# Altium schematic symbol library Regulator_Switching.SchLib: 1120 symbols (part 6 of 8)
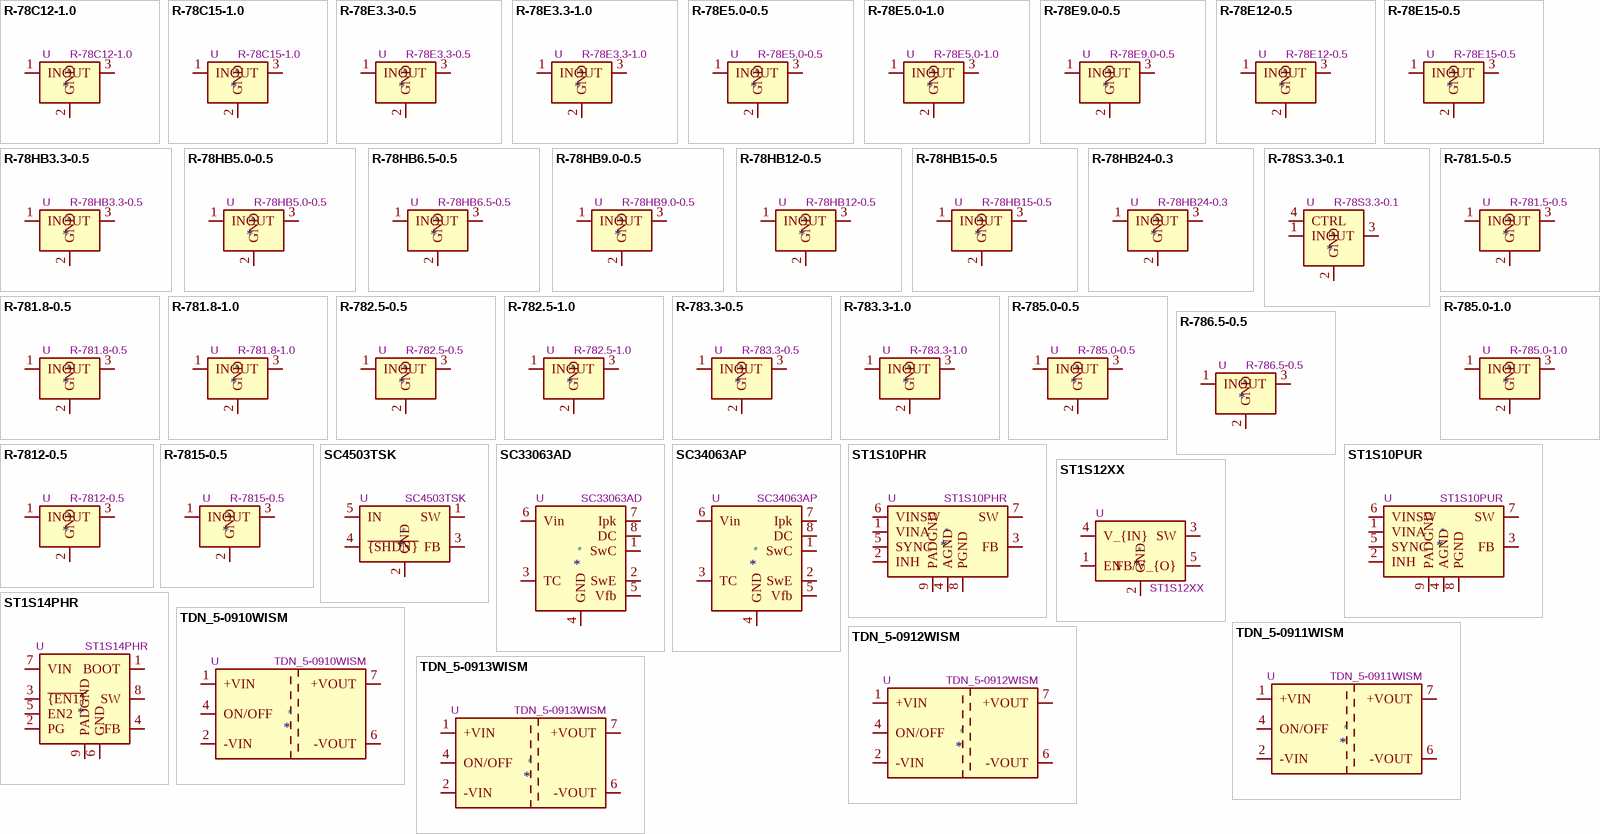
[diagram p32: symbols R-78C12-1.0 to TDN_5-0913WISM]

## TDN_5-0913WISM
designator *  value TDN_5-0913WISM  Reference: U
ki_keywords: dcdc traco 5W; ki_description: Input 4.5 to 13.2V, Output 15.0V; ki_fp_filters: Converter?DCDC?TRACO?TDN?5*WISM?SMD*; Footprint: Converter_DCDC:Converter_DCDC_TRACO_TDN_5-xxxxWISM_SMD; Datasheet: https://assets.tracopower.com/20190626081517/TDN5WISM/documents/tdn5wism-datasheet.pdf
pins: 1 +VIN, 2 -VIN, 4 ON/OFF, 5 NC hidden, 6 -VOUT, 7 +VOUT

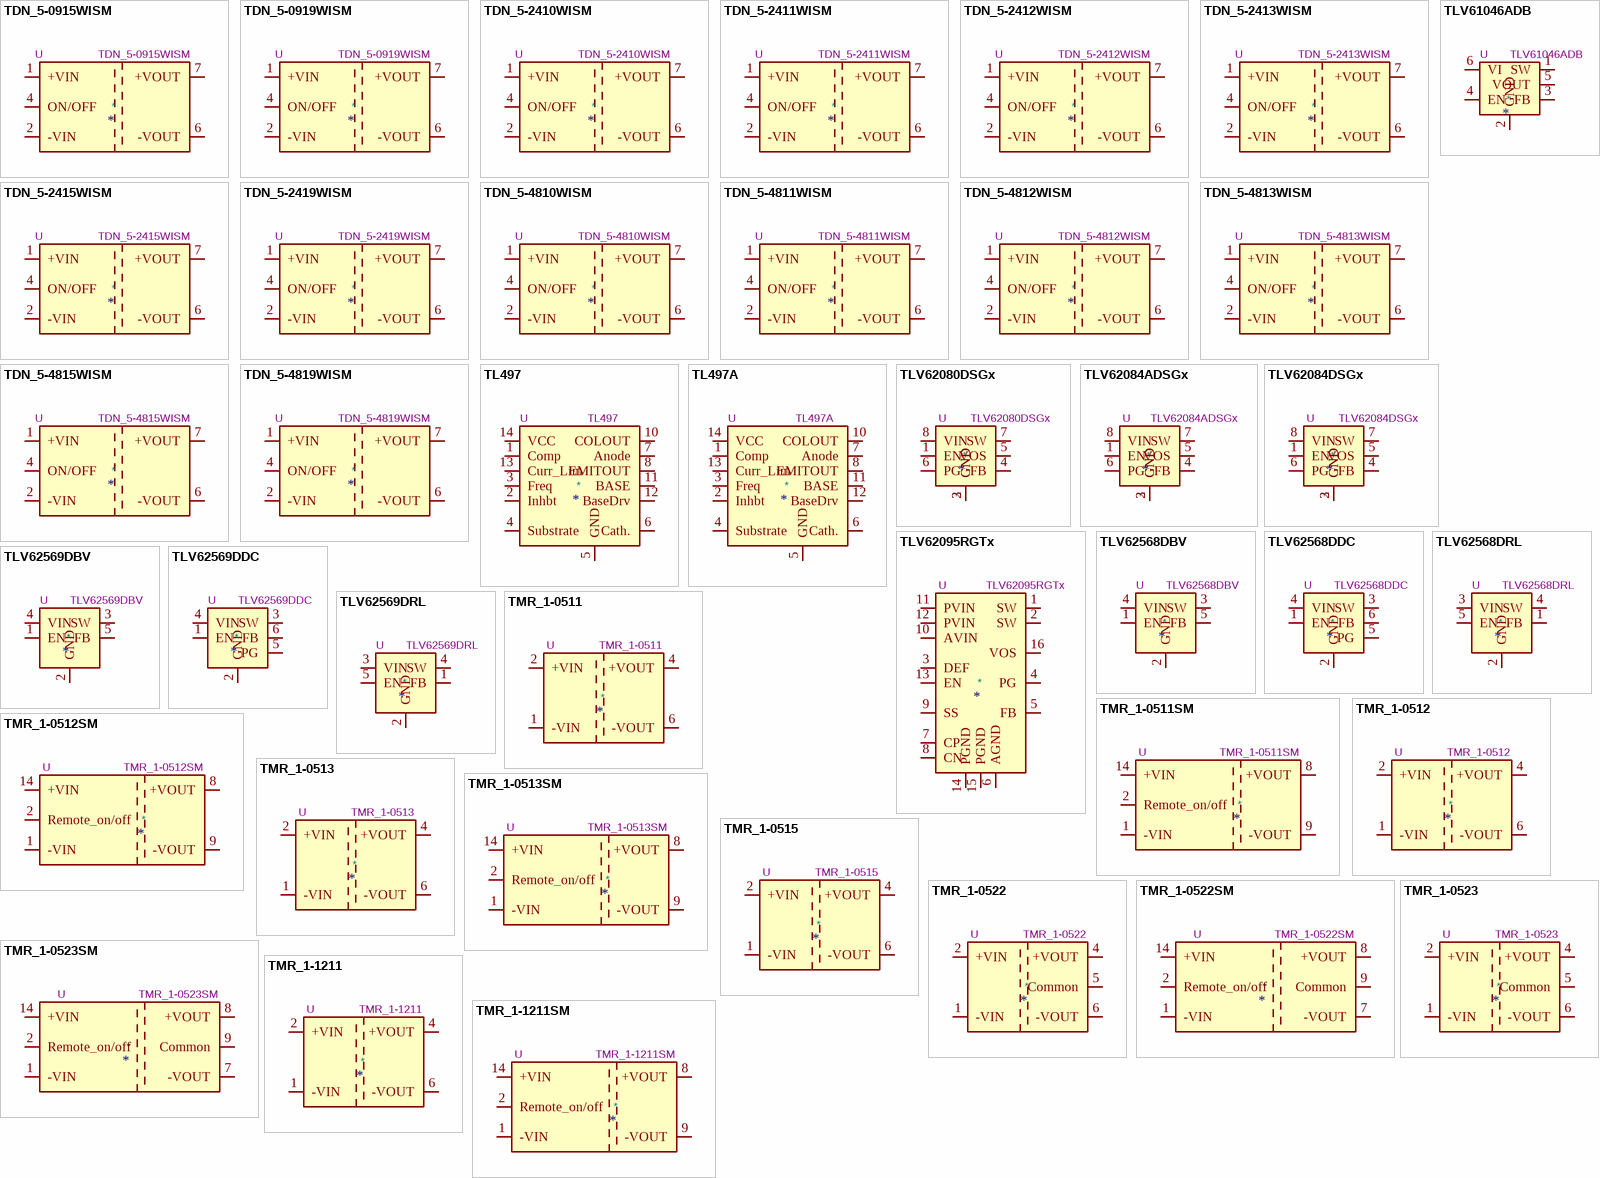
[diagram p19: symbols TDN_5-0915WISM to TMR_1-1211SM]

## TDN_5-0915WISM
designator *  value TDN_5-0915WISM  Reference: U
ki_keywords: dcdc traco 5W; ki_description: Input 4.5 to 13.2V, Output 24.0V; ki_fp_filters: Converter?DCDC?TRACO?TDN?5*WISM?SMD*; Footprint: Converter_DCDC:Converter_DCDC_TRACO_TDN_5-xxxxWISM_SMD; Datasheet: https://assets.tracopower.com/20190626081517/TDN5WISM/documents/tdn5wism-datasheet.pdf
pins: 1 +VIN, 2 -VIN, 4 ON/OFF, 5 NC hidden, 6 -VOUT, 7 +VOUT

## TDN_5-0919WISM
designator *  value TDN_5-0919WISM  Reference: U
ki_keywords: dcdc traco 5W; ki_description: Input 4.5 to 13.2V, Output 9.0V; ki_fp_filters: Converter?DCDC?TRACO?TDN?5*WISM?SMD*; Footprint: Converter_DCDC:Converter_DCDC_TRACO_TDN_5-xxxxWISM_SMD; Datasheet: https://assets.tracopower.com/20190626081517/TDN5WISM/documents/tdn5wism-datasheet.pdf
pins: 1 +VIN, 2 -VIN, 4 ON/OFF, 5 NC hidden, 6 -VOUT, 7 +VOUT

## TDN_5-2410WISM
designator *  value TDN_5-2410WISM  Reference: U
ki_keywords: dcdc traco 5W; ki_description: Input 9.0 to 36.0V, Output 3.3V; ki_fp_filters: Converter?DCDC?TRACO?TDN?5*WISM?SMD*; Footprint: Converter_DCDC:Converter_DCDC_TRACO_TDN_5-xxxxWISM_SMD; Datasheet: https://assets.tracopower.com/20190626081517/TDN5WISM/documents/tdn5wism-datasheet.pdf
pins: 1 +VIN, 2 -VIN, 4 ON/OFF, 5 NC hidden, 6 -VOUT, 7 +VOUT

## TDN_5-2411WISM
designator *  value TDN_5-2411WISM  Reference: U
ki_keywords: dcdc traco 5W; ki_description: Input 9.0 to 36.0V, Output 5.0V; ki_fp_filters: Converter?DCDC?TRACO?TDN?5*WISM?SMD*; Footprint: Converter_DCDC:Converter_DCDC_TRACO_TDN_5-xxxxWISM_SMD; Datasheet: https://assets.tracopower.com/20190626081517/TDN5WISM/documents/tdn5wism-datasheet.pdf
pins: 1 +VIN, 2 -VIN, 4 ON/OFF, 5 NC hidden, 6 -VOUT, 7 +VOUT

## TDN_5-2412WISM
designator *  value TDN_5-2412WISM  Reference: U
ki_keywords: dcdc traco 5W; ki_description: Input 9.0 to 36.0V, Output 12.0V; ki_fp_filters: Converter?DCDC?TRACO?TDN?5*WISM?SMD*; Footprint: Converter_DCDC:Converter_DCDC_TRACO_TDN_5-xxxxWISM_SMD; Datasheet: https://assets.tracopower.com/20190626081517/TDN5WISM/documents/tdn5wism-datasheet.pdf
pins: 1 +VIN, 2 -VIN, 4 ON/OFF, 5 NC hidden, 6 -VOUT, 7 +VOUT

## TDN_5-2413WISM
designator *  value TDN_5-2413WISM  Reference: U
ki_keywords: dcdc traco 5W; ki_description: Input 9.0 to 36.0V, Output 15.0V; ki_fp_filters: Converter?DCDC?TRACO?TDN?5*WISM?SMD*; Footprint: Converter_DCDC:Converter_DCDC_TRACO_TDN_5-xxxxWISM_SMD; Datasheet: https://assets.tracopower.com/20190626081517/TDN5WISM/documents/tdn5wism-datasheet.pdf
pins: 1 +VIN, 2 -VIN, 4 ON/OFF, 5 NC hidden, 6 -VOUT, 7 +VOUT

## TDN_5-2415WISM
designator *  value TDN_5-2415WISM  Reference: U
ki_keywords: dcdc traco 5W; ki_description: Input 9.0 to 36.0V, Output 24.0V; ki_fp_filters: Converter?DCDC?TRACO?TDN?5*WISM?SMD*; Footprint: Converter_DCDC:Converter_DCDC_TRACO_TDN_5-xxxxWISM_SMD; Datasheet: https://assets.tracopower.com/20190626081517/TDN5WISM/documents/tdn5wism-datasheet.pdf
pins: 1 +VIN, 2 -VIN, 4 ON/OFF, 5 NC hidden, 6 -VOUT, 7 +VOUT

## TDN_5-2419WISM
designator *  value TDN_5-2419WISM  Reference: U
ki_keywords: dcdc traco 5WW; ki_description: Input 9.0 to 36.0V, Output 9.0V; ki_fp_filters: Converter?DCDC?TRACO?TDN?5*WISM?SMD*; Footprint: Converter_DCDC:Converter_DCDC_TRACO_TDN_5-xxxxWISM_SMD; Datasheet: https://assets.tracopower.com/20190626081517/TDN5WISM/documents/tdn5wism-datasheet.pdf
pins: 1 +VIN, 2 -VIN, 4 ON/OFF, 5 NC hidden, 6 -VOUT, 7 +VOUT

## TDN_5-4810WISM
designator *  value TDN_5-4810WISM  Reference: U
ki_keywords: dcdc traco 5W; ki_description: Input 18.0 to 75.0V, Output 3.3V; ki_fp_filters: Converter?DCDC?TRACO?TDN?5*WISM?SMD*; Footprint: Converter_DCDC:Converter_DCDC_TRACO_TDN_5-xxxxWISM_SMD; Datasheet: https://assets.tracopower.com/20190626081517/TDN5WISM/documents/tdn5wism-datasheet.pdf
pins: 1 +VIN, 2 -VIN, 4 ON/OFF, 5 NC hidden, 6 -VOUT, 7 +VOUT

## TDN_5-4811WISM
designator *  value TDN_5-4811WISM  Reference: U
ki_keywords: dcdc traco 5W; ki_description: Input 18.0 to 75.0V, Output 5.0V; ki_fp_filters: Converter?DCDC?TRACO?TDN?5*WISM?SMD*; Footprint: Converter_DCDC:Converter_DCDC_TRACO_TDN_5-xxxxWISM_SMD; Datasheet: https://assets.tracopower.com/20190626081517/TDN5WISM/documents/tdn5wism-datasheet.pdf
pins: 1 +VIN, 2 -VIN, 4 ON/OFF, 5 NC hidden, 6 -VOUT, 7 +VOUT

## TDN_5-4812WISM
designator *  value TDN_5-4812WISM  Reference: U
ki_keywords: dcdc traco 5W; ki_description: Input 18.0 to 75.0V, Output 12.0V; ki_fp_filters: Converter?DCDC?TRACO?TDN?5*WISM?SMD*; Footprint: Converter_DCDC:Converter_DCDC_TRACO_TDN_5-xxxxWISM_SMD; Datasheet: https://assets.tracopower.com/20190626081517/TDN5WISM/documents/tdn5wism-datasheet.pdf
pins: 1 +VIN, 2 -VIN, 4 ON/OFF, 5 NC hidden, 6 -VOUT, 7 +VOUT

## TDN_5-4813WISM
designator *  value TDN_5-4813WISM  Reference: U
ki_keywords: dcdc traco 5W; ki_description: Input 18.0 to 75.0V, Output 15.0V; ki_fp_filters: Converter?DCDC?TRACO?TDN?5*WISM?SMD*; Footprint: Converter_DCDC:Converter_DCDC_TRACO_TDN_5-xxxxWISM_SMD; Datasheet: https://assets.tracopower.com/20190626081517/TDN5WISM/documents/tdn5wism-datasheet.pdf
pins: 1 +VIN, 2 -VIN, 4 ON/OFF, 5 NC hidden, 6 -VOUT, 7 +VOUT

## TDN_5-4815WISM
designator *  value TDN_5-4815WISM  Reference: U
ki_keywords: dcdc traco 5W; ki_description: Input 18.0 to 75.0V, Output 24.0V; ki_fp_filters: Converter?DCDC?TRACO?TDN?5*WISM?SMD*; Footprint: Converter_DCDC:Converter_DCDC_TRACO_TDN_5-xxxxWISM_SMD; Datasheet: https://assets.tracopower.com/20190626081517/TDN5WISM/documents/tdn5wism-datasheet.pdf
pins: 1 +VIN, 2 -VIN, 4 ON/OFF, 5 NC hidden, 6 -VOUT, 7 +VOUT

## TDN_5-4819WISM
designator *  value TDN_5-4819WISM  Reference: U
ki_keywords: dcdc traco 5W; ki_description: Input 18.0 to 75.0V, Output 9.0V; ki_fp_filters: Converter?DCDC?TRACO?TDN?5*WISM?SMD*; Footprint: Converter_DCDC:Converter_DCDC_TRACO_TDN_5-xxxxWISM_SMD; Datasheet: https://assets.tracopower.com/20190626081517/TDN5WISM/documents/tdn5wism-datasheet.pdf
pins: 1 +VIN, 2 -VIN, 4 ON/OFF, 5 NC hidden, 6 -VOUT, 7 +VOUT

## TL497
designator *  value TL497  Reference: U
ki_keywords: buck regulator; ki_description: 500mA step up/step down/inverting switching voltage regulator, SIP-14/SOIC-14(W); ki_fp_filters: DIP*W7.62mm* SOIC*7.5x9.0mm*P1.27mm* SOIC*3.9x8.7mm*P1.27mm*; Datasheet: http://www.ti.com/lit/ds/symlink/tl497a.pdf
pins: 1 Comp, 2 Inhbt, 3 Freq, 4 Substrate, 5 GND, 6 Cath., 7 Anode, 8 EMITOUT, 9 NC hidden, 10 COLOUT, 11 BASE, 12 BaseDrv, 13 Curr_Lim, 14 VCC

## TL497A
designator *  value TL497A  Reference: U
ki_keywords: buck regulator; ki_description: 500mA step up/step down switching regulator; ki_fp_filters: DIP*W7.62mm* SOIC*7.5x9.0mm*P1.27mm* SOIC*3.9x8.7mm*P1.27mm*; Datasheet: http://www.ti.com/lit/ds/symlink/tl497a.pdf
pins: 1 Comp, 2 Inhbt, 3 Freq, 4 Substrate, 5 GND, 6 Cath., 7 Anode, 8 EMITOUT, 9 NC hidden, 10 COLOUT, 11 BASE, 12 BaseDrv, 13 Curr_Lim, 14 VCC

## TLV61046ADB
designator *  value TLV61046ADB  Reference: U
ki_keywords: Step-Up DC-DC Converter; ki_description: 28-V Output Voltage Boost Converter with Power Diode and Isolation Switch, SOT-23-6; ki_fp_filters: SOT?23*; Footprint: Package_TO_SOT_SMD:SOT-23-6; Datasheet: http://www.ti.com/lit/ds/symlink/tlv61046a.pdf
pins: 1 SW, 2 GND, 3 FB, 4 EN, 5 VOUT, 6 VI

## TLV62080DSGx
designator *  value TLV62080DSGx  Reference: U
ki_keywords: Synchronous Buck; ki_description: High-efficiency Step-down Converter; ki_fp_filters: *WSON?8?1EP*2x2mm*P0.5mm*; Footprint: Package_SON:WSON-8-1EP_2x2mm_P0.5mm_EP0.9x1.6mm; Datasheet: http://www.ti.com/lit/ds/symlink/tlv62080.pdf
pins: 1 EN, 2 GND, 3 GND, 4 FB, 5 VOS, 6 PG, 7 SW, 8 VIN, 9 GND hidden

## TLV62084ADSGx
designator *  value TLV62084ADSGx  Reference: U
ki_keywords: Synchronous Buck; ki_description: High-efficiency Step-down Converter; ki_fp_filters: *WSON?8?1EP*2x2mm*P0.5mm*; Footprint: Package_SON:WSON-8-1EP_2x2mm_P0.5mm_EP0.9x1.6mm; Datasheet: http://www.ti.com/lit/ds/symlink/tlv62080.pdf
pins: 1 EN, 2 GND, 3 GND, 4 FB, 5 VOS, 6 PG, 7 SW, 8 VIN, 9 GND hidden

## TLV62084DSGx
designator *  value TLV62084DSGx  Reference: U
ki_keywords: Synchronous Buck; ki_description: High-efficiency Step-down Converter; ki_fp_filters: *WSON?8?1EP*2x2mm*P0.5mm*; Footprint: Package_SON:WSON-8-1EP_2x2mm_P0.5mm_EP0.9x1.6mm; Datasheet: http://www.ti.com/lit/ds/symlink/tlv62080.pdf
pins: 1 EN, 2 GND, 3 GND, 4 FB, 5 VOS, 6 PG, 7 SW, 8 VIN, 9 GND hidden

## TLV62095RGTx
designator *  value TLV62095RGTx  Reference: U
ki_keywords: Synchronous Buck; ki_description: High efficiency step-down converter; ki_fp_filters: VQFN*1EP*3x3mm*P0.5mm*; Footprint: Package_DFN_QFN:VQFN-16-1EP_3x3mm_P0.5mm_EP1.68x1.68mm_ThermalVias; Datasheet: http://www.ti.com/lit/ds/symlink/tlv62095.pdf
pins: 1 SW, 2 SW, 3 DEF, 4 PG, 5 FB, 6 AGND, 7 CP, 8 CN, 9 SS, 10 AVIN, 11 PVIN, 12 PVIN, 13 EN, 14 PGND, 15 PGND, 16 VOS, 17 AGND hidden

## TLV62568DBV
designator *  value TLV62568DBV  Reference: U
ki_keywords: Step-Down Buck DC-DC Regulator Adjustable; ki_description: High Efficiency Synchronous Buck Converter, Adjustable Output 0.6V-5.5V, 1A, SOT-23-5; ki_fp_filters: SOT?23*; Footprint: Package_TO_SOT_SMD:SOT-23-5; Datasheet: http://www.ti.com/lit/ds/symlink/tlv62568.pdf
pins: 1 EN, 2 GND, 3 SW, 4 VIN, 5 FB

## TLV62568DDC
designator *  value TLV62568DDC  Reference: U
ki_keywords: Step-Down Buck DC-DC Regulator Adjustable; ki_description: High Efficiency Synchronous Buck Converter, Adjustable Output 0.6V-5.5V, 1A, SOT-23-6; ki_fp_filters: SOT?23*; Footprint: Package_TO_SOT_SMD:SOT-23-6; Datasheet: http://www.ti.com/lit/ds/symlink/tlv62568.pdf
pins: 1 EN, 2 GND, 3 SW, 4 VIN, 5 PG, 6 FB

## TLV62568DRL
designator *  value TLV62568DRL  Reference: U
ki_keywords: Step-Down Buck DC-DC Regulator Adjustable; ki_description: High Efficiency Synchronous Buck Converter, Adjustable Output 0.6V-5.5V, 1A, SOT-563-6; ki_fp_filters: SOT*563*; Footprint: Package_TO_SOT_SMD:SOT-563; Datasheet: http://www.ti.com/lit/ds/symlink/tlv62568.pdf
pins: 1 FB, 2 GND, 3 VIN, 4 SW, 5 EN, 6 NC hidden

## TLV62569DBV
designator *  value TLV62569DBV  Reference: U
ki_keywords: Step-Down Buck DC-DC Regulator Adjustable; ki_description: High Efficiency Synchronous Buck Converter, Adjustable Output 0.6V-5.5V, 2A, SOT-23-5; ki_fp_filters: SOT?23*; Footprint: Package_TO_SOT_SMD:SOT-23-5; Datasheet: http://www.ti.com/lit/ds/symlink/tlv62569.pdf
pins: 1 EN, 2 GND, 3 SW, 4 VIN, 5 FB

## TLV62569DDC
designator *  value TLV62569DDC  Reference: U
ki_keywords: Step-Down Buck DC-DC Regulator Adjustable; ki_description: High Efficiency Synchronous Buck Converter, Adjustable Output 0.6V-5.5V, 2A, SOT-23-6; ki_fp_filters: SOT?23*; Footprint: Package_TO_SOT_SMD:SOT-23-6; Datasheet: http://www.ti.com/lit/ds/symlink/tlv62569.pdf
pins: 1 EN, 2 GND, 3 SW, 4 VIN, 5 PG, 6 FB

## TLV62569DRL
designator *  value TLV62569DRL  Reference: U
ki_keywords: Step-Down Buck DC-DC Regulator Adjustable; ki_description: High Efficiency Synchronous Buck Converter, Adjustable Output 0.6V-5.5V, 2A, SOT-563-6; ki_fp_filters: SOT*563*; Footprint: Package_TO_SOT_SMD:SOT-563; Datasheet: http://www.ti.com/lit/ds/symlink/tlv62569.pdf
pins: 1 FB, 2 GND, 3 VIN, 4 SW, 5 EN, 6 NC hidden

## TMR_1-0511
designator *  value TMR_1-0511  Reference: U
ki_keywords: Murata isolated isolation dc-dc converter transformer; ki_description: 200mA Regulated 1W DC/DC converter with 1.5kV isolation, 4.5V-9V input, 5V fixed Output Voltage, SIP-6; ki_fp_filters: Converter*DCDC*TRACO*TMR?1*Single*; Footprint: Converter_DCDC:Converter_DCDC_TRACO_TMR-1-xxxx_Single_THT; Datasheet: http://assets.tracopower.com/TMR1/documents/tmr1-datasheet.pdf
pins: 1 -VIN, 2 +VIN, 4 +VOUT, 6 -VOUT

## TMR_1-0511SM
designator *  value TMR_1-0511SM  Reference: U
ki_keywords: Murata isolated isolation dc-dc converter transformer; ki_description: 200mA Regulated 1W DC/DC converter with 1.5kV isolation, 4.5V-9V input, 5V fixed Output Voltage, SMD; ki_fp_filters: Converter*DCDC*TRACO*TMR?1SM*; Footprint: Converter_DCDC:Converter_DCDC_TRACO_TMR-1SM_SMD; Datasheet: http://assets.tracopower.com/TMR1SM/documents/tmr1sm-datasheet.pdf
pins: 1 -VIN, 2 Remote_on/off, 6 NC hidden, 7 NC hidden, 8 +VOUT, 9 -VOUT, 14 +VIN

## TMR_1-0512
designator *  value TMR_1-0512  Reference: U
ki_keywords: Murata isolated isolation dc-dc converter transformer; ki_description: 83mA Regulated 1W DC/DC converter with 1.5kV isolation, 4.5V-9V input, 12V fixed Output Voltage, SIP-6; ki_fp_filters: Converter*DCDC*TRACO*TMR?1*Single*; Footprint: Converter_DCDC:Converter_DCDC_TRACO_TMR-1-xxxx_Single_THT; Datasheet: http://assets.tracopower.com/TMR1/documents/tmr1-datasheet.pdf
pins: 1 -VIN, 2 +VIN, 4 +VOUT, 6 -VOUT

## TMR_1-0512SM
designator *  value TMR_1-0512SM  Reference: U
ki_keywords: Murata isolated isolation dc-dc converter transformer; ki_description: 83mA Regulated 1W DC/DC converter with 1.5kV isolation, 4.5V-9V input, 12V fixed Output Voltage, SMD; ki_fp_filters: Converter*DCDC*TRACO*TMR?1SM*; Footprint: Converter_DCDC:Converter_DCDC_TRACO_TMR-1SM_SMD; Datasheet: http://assets.tracopower.com/TMR1SM/documents/tmr1sm-datasheet.pdf
pins: 1 -VIN, 2 Remote_on/off, 6 NC hidden, 7 NC hidden, 8 +VOUT, 9 -VOUT, 14 +VIN

## TMR_1-0513
designator *  value TMR_1-0513  Reference: U
ki_keywords: Murata isolated isolation dc-dc converter transformer; ki_description: 67mA Regulated 1W DC/DC converter with 1.5kV isolation, 4.5V-9V input, 15V fixed Output Voltage, SIP-6; ki_fp_filters: Converter*DCDC*TRACO*TMR?1*Single*; Footprint: Converter_DCDC:Converter_DCDC_TRACO_TMR-1-xxxx_Single_THT; Datasheet: http://assets.tracopower.com/TMR1/documents/tmr1-datasheet.pdf
pins: 1 -VIN, 2 +VIN, 4 +VOUT, 6 -VOUT

## TMR_1-0513SM
designator *  value TMR_1-0513SM  Reference: U
ki_keywords: Murata isolated isolation dc-dc converter transformer; ki_description: 67mA Regulated 1W DC/DC converter with 1.5kV isolation, 4.5V-9V input, 15V fixed Output Voltage, SMD; ki_fp_filters: Converter*DCDC*TRACO*TMR?1SM*; Footprint: Converter_DCDC:Converter_DCDC_TRACO_TMR-1SM_SMD; Datasheet: http://assets.tracopower.com/TMR1SM/documents/tmr1sm-datasheet.pdf
pins: 1 -VIN, 2 Remote_on/off, 6 NC hidden, 7 NC hidden, 8 +VOUT, 9 -VOUT, 14 +VIN

## TMR_1-0515
designator *  value TMR_1-0515  Reference: U
ki_keywords: Murata isolated isolation dc-dc converter transformer; ki_description: 42mA Regulated 1W DC/DC converter with 1.5kV isolation, 4.5V-9V input, 24V fixed Output Voltage, SIP-6; ki_fp_filters: Converter*DCDC*TRACO*TMR?1*Single*; Footprint: Converter_DCDC:Converter_DCDC_TRACO_TMR-1-xxxx_Single_THT; Datasheet: http://assets.tracopower.com/TMR1/documents/tmr1-datasheet.pdf
pins: 1 -VIN, 2 +VIN, 4 +VOUT, 6 -VOUT

## TMR_1-0522
designator *  value TMR_1-0522  Reference: U
ki_keywords: Murata isolated isolation dc-dc converter transformer; ki_description: +/-42mA Regulated 1W DC/DC converter with 1.5kV isolation, 4.5V-9V input, +/-12V fixed Output Voltage, SIP-6; ki_fp_filters: Converter*DCDC*TRACO*TMR?1*Dual*; Footprint: Converter_DCDC:Converter_DCDC_TRACO_TMR-1-xxxx_Dual_THT; Datasheet: http://assets.tracopower.com/TMR1/documents/tmr1-datasheet.pdf
pins: 1 -VIN, 2 +VIN, 4 +VOUT, 5 Common, 6 -VOUT

## TMR_1-0522SM
designator *  value TMR_1-0522SM  Reference: U
ki_keywords: Murata isolated isolation dc-dc converter transformer; ki_description: +/-42mA Regulated 1W DC/DC converter with 1.5kV isolation, 4.5V-9V input, +/-12V fixed Output Voltage, SMD; ki_fp_filters: Converter*DCDC*TRACO*TMR-1SM*SMD*; Footprint: Converter_DCDC:Converter_DCDC_TRACO_TMR-1SM_SMD; Datasheet: http://assets.tracopower.com/TMR1SM/documents/tmr1sm-datasheet.pdf
pins: 1 -VIN, 2 Remote_on/off, 6 Common hidden, 7 -VOUT, 8 +VOUT, 9 Common, 14 +VIN

## TMR_1-0523
designator *  value TMR_1-0523  Reference: U
ki_keywords: Murata isolated isolation dc-dc converter transformer; ki_description: +/-33mA Regulated 1W DC/DC converter with 1.5kV isolation, 4.5V-9V input, +/-15V fixed Output Voltage, SIP-6; ki_fp_filters: Converter*DCDC*TRACO*TMR?1*Dual*; Footprint: Converter_DCDC:Converter_DCDC_TRACO_TMR-1-xxxx_Dual_THT; Datasheet: http://assets.tracopower.com/TMR1/documents/tmr1-datasheet.pdf
pins: 1 -VIN, 2 +VIN, 4 +VOUT, 5 Common, 6 -VOUT

## TMR_1-0523SM
designator *  value TMR_1-0523SM  Reference: U
ki_keywords: Murata isolated isolation dc-dc converter transformer; ki_description: +/-33mA Regulated 1W DC/DC converter with 1.5kV isolation, 4.5V-9V input, +/-15V fixed Output Voltage, SMD; ki_fp_filters: Converter*DCDC*TRACO*TMR-1SM*SMD*; Footprint: Converter_DCDC:Converter_DCDC_TRACO_TMR-1SM_SMD; Datasheet: http://assets.tracopower.com/TMR1SM/documents/tmr1sm-datasheet.pdf
pins: 1 -VIN, 2 Remote_on/off, 6 Common hidden, 7 -VOUT, 8 +VOUT, 9 Common, 14 +VIN

## TMR_1-1211
designator *  value TMR_1-1211  Reference: U
ki_keywords: Murata isolated isolation dc-dc converter transformer; ki_description: 200mA Regulated 1W DC/DC converter with 1.5kV isolation, 9V-18V input, 5V fixed Output Voltage, SIP-6; ki_fp_filters: Converter*DCDC*TRACO*TMR?1*Single*; Footprint: Converter_DCDC:Converter_DCDC_TRACO_TMR-1-xxxx_Single_THT; Datasheet: http://assets.tracopower.com/TMR1/documents/tmr1-datasheet.pdf
pins: 1 -VIN, 2 +VIN, 4 +VOUT, 6 -VOUT

## TMR_1-1211SM
designator *  value TMR_1-1211SM  Reference: U
ki_keywords: Murata isolated isolation dc-dc converter transformer; ki_description: 200mA Regulated 1W DC/DC converter with 1.5kV isolation, 9V-18V input, 5V fixed Output Voltage, SMD; ki_fp_filters: Converter*DCDC*TRACO*TMR?1SM*; Footprint: Converter_DCDC:Converter_DCDC_TRACO_TMR-1SM_SMD; Datasheet: http://assets.tracopower.com/TMR1SM/documents/tmr1sm-datasheet.pdf
pins: 1 -VIN, 2 Remote_on/off, 6 NC hidden, 7 NC hidden, 8 +VOUT, 9 -VOUT, 14 +VIN

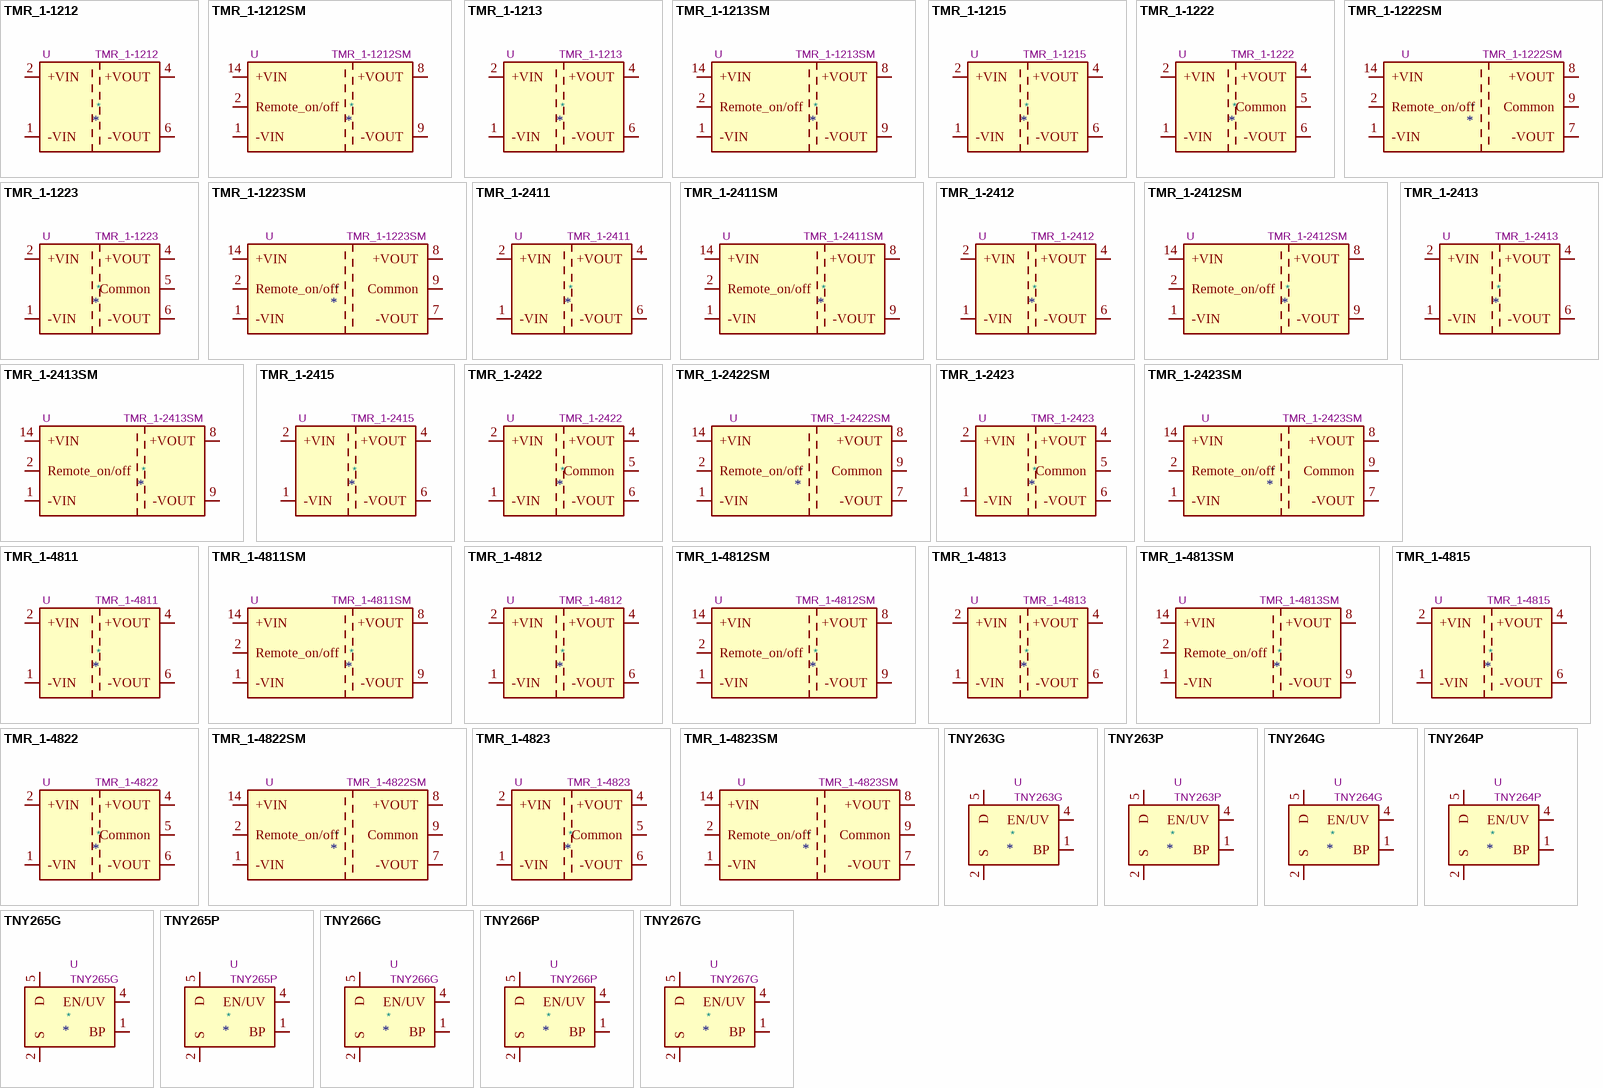
[diagram p20: symbols TMR_1-1212 to TNY267G]

## TMR_1-1212
designator *  value TMR_1-1212  Reference: U
ki_keywords: Murata isolated isolation dc-dc converter transformer; ki_description: 83mA Regulated 1W DC/DC converter with 1.5kV isolation, 9V-18V input, 12V fixed Output Voltage, SIP-6; ki_fp_filters: Converter*DCDC*TRACO*TMR?1*Single*; Footprint: Converter_DCDC:Converter_DCDC_TRACO_TMR-1-xxxx_Single_THT; Datasheet: http://assets.tracopower.com/TMR1/documents/tmr1-datasheet.pdf
pins: 1 -VIN, 2 +VIN, 4 +VOUT, 6 -VOUT

## TMR_1-1212SM
designator *  value TMR_1-1212SM  Reference: U
ki_keywords: Murata isolated isolation dc-dc converter transformer; ki_description: 83mA Regulated 1W DC/DC converter with 1.5kV isolation, 9V-18V input, 12V fixed Output Voltage, SMD; ki_fp_filters: Converter*DCDC*TRACO*TMR?1SM*; Footprint: Converter_DCDC:Converter_DCDC_TRACO_TMR-1SM_SMD; Datasheet: http://assets.tracopower.com/TMR1SM/documents/tmr1sm-datasheet.pdf
pins: 1 -VIN, 2 Remote_on/off, 6 NC hidden, 7 NC hidden, 8 +VOUT, 9 -VOUT, 14 +VIN

## TMR_1-1213
designator *  value TMR_1-1213  Reference: U
ki_keywords: Murata isolated isolation dc-dc converter transformer; ki_description: 67mA Regulated 1W DC/DC converter with 1.5kV isolation, 9V-18V input, 15V fixed Output Voltage, SIP-6; ki_fp_filters: Converter*DCDC*TRACO*TMR?1*Single*; Footprint: Converter_DCDC:Converter_DCDC_TRACO_TMR-1-xxxx_Single_THT; Datasheet: http://assets.tracopower.com/TMR1/documents/tmr1-datasheet.pdf
pins: 1 -VIN, 2 +VIN, 4 +VOUT, 6 -VOUT

## TMR_1-1213SM
designator *  value TMR_1-1213SM  Reference: U
ki_keywords: Murata isolated isolation dc-dc converter transformer; ki_description: 67mA Regulated 1W DC/DC converter with 1.5kV isolation, 9V-18V input, 15V fixed Output Voltage, SMD; ki_fp_filters: Converter*DCDC*TRACO*TMR?1SM*; Footprint: Converter_DCDC:Converter_DCDC_TRACO_TMR-1SM_SMD; Datasheet: http://assets.tracopower.com/TMR1SM/documents/tmr1sm-datasheet.pdf
pins: 1 -VIN, 2 Remote_on/off, 6 NC hidden, 7 NC hidden, 8 +VOUT, 9 -VOUT, 14 +VIN

## TMR_1-1215
designator *  value TMR_1-1215  Reference: U
ki_keywords: Murata isolated isolation dc-dc converter transformer; ki_description: 42mA Regulated 1W DC/DC converter with 1.5kV isolation, 9V-18V input, 24V fixed Output Voltage, SIP-6; ki_fp_filters: Converter*DCDC*TRACO*TMR?1*Single*; Footprint: Converter_DCDC:Converter_DCDC_TRACO_TMR-1-xxxx_Single_THT; Datasheet: http://assets.tracopower.com/TMR1/documents/tmr1-datasheet.pdf
pins: 1 -VIN, 2 +VIN, 4 +VOUT, 6 -VOUT

## TMR_1-1222
designator *  value TMR_1-1222  Reference: U
ki_keywords: Murata isolated isolation dc-dc converter transformer; ki_description: +/-42mA Regulated 1W DC/DC converter with 1.5kV isolation, 9V-18V input, +/-12V fixed Output Voltage, SIP-6; ki_fp_filters: Converter*DCDC*TRACO*TMR?1*Dual*; Footprint: Converter_DCDC:Converter_DCDC_TRACO_TMR-1-xxxx_Dual_THT; Datasheet: http://assets.tracopower.com/TMR1/documents/tmr1-datasheet.pdf
pins: 1 -VIN, 2 +VIN, 4 +VOUT, 5 Common, 6 -VOUT

## TMR_1-1222SM
designator *  value TMR_1-1222SM  Reference: U
ki_keywords: Murata isolated isolation dc-dc converter transformer; ki_description: +/-42mA Regulated 1W DC/DC converter with 1.5kV isolation, 9V-18V input, +/-12V fixed Output Voltage, SMD; ki_fp_filters: Converter*DCDC*TRACO*TMR-1SM*SMD*; Footprint: Converter_DCDC:Converter_DCDC_TRACO_TMR-1SM_SMD; Datasheet: http://assets.tracopower.com/TMR1SM/documents/tmr1sm-datasheet.pdf
pins: 1 -VIN, 2 Remote_on/off, 6 Common hidden, 7 -VOUT, 8 +VOUT, 9 Common, 14 +VIN

## TMR_1-1223
designator *  value TMR_1-1223  Reference: U
ki_keywords: Murata isolated isolation dc-dc converter transformer; ki_description: +/-33mA Regulated 1W DC/DC converter with 1.5kV isolation, 9V-18V input, +/-15V fixed Output Voltage, SIP-6; ki_fp_filters: Converter*DCDC*TRACO*TMR?1*Dual*; Footprint: Converter_DCDC:Converter_DCDC_TRACO_TMR-1-xxxx_Dual_THT; Datasheet: http://assets.tracopower.com/TMR1/documents/tmr1-datasheet.pdf
pins: 1 -VIN, 2 +VIN, 4 +VOUT, 5 Common, 6 -VOUT

## TMR_1-1223SM
designator *  value TMR_1-1223SM  Reference: U
ki_keywords: Murata isolated isolation dc-dc converter transformer; ki_description: +/-33mA Regulated 1W DC/DC converter with 1.5kV isolation, 9V-18V input, +/-15V fixed Output Voltage, SMD; ki_fp_filters: Converter*DCDC*TRACO*TMR-1SM*SMD*; Footprint: Converter_DCDC:Converter_DCDC_TRACO_TMR-1SM_SMD; Datasheet: http://assets.tracopower.com/TMR1SM/documents/tmr1sm-datasheet.pdf
pins: 1 -VIN, 2 Remote_on/off, 6 Common hidden, 7 -VOUT, 8 +VOUT, 9 Common, 14 +VIN

## TMR_1-2411
designator *  value TMR_1-2411  Reference: U
ki_keywords: Murata isolated isolation dc-dc converter transformer; ki_description: 200mA Regulated 1W DC/DC converter with 1.5kV isolation, 18V-36V input, 5V fixed Output Voltage, SIP-6; ki_fp_filters: Converter*DCDC*TRACO*TMR?1*Single*; Footprint: Converter_DCDC:Converter_DCDC_TRACO_TMR-1-xxxx_Single_THT; Datasheet: http://assets.tracopower.com/TMR1/documents/tmr1-datasheet.pdf
pins: 1 -VIN, 2 +VIN, 4 +VOUT, 6 -VOUT

## TMR_1-2411SM
designator *  value TMR_1-2411SM  Reference: U
ki_keywords: Murata isolated isolation dc-dc converter transformer; ki_description: 200mA Regulated 1W DC/DC converter with 1.5kV isolation, 18V-36V input, 5V fixed Output Voltage, SMD; ki_fp_filters: Converter*DCDC*TRACO*TMR?1SM*; Footprint: Converter_DCDC:Converter_DCDC_TRACO_TMR-1SM_SMD; Datasheet: http://assets.tracopower.com/TMR1SM/documents/tmr1sm-datasheet.pdf
pins: 1 -VIN, 2 Remote_on/off, 6 NC hidden, 7 NC hidden, 8 +VOUT, 9 -VOUT, 14 +VIN

## TMR_1-2412
designator *  value TMR_1-2412  Reference: U
ki_keywords: Murata isolated isolation dc-dc converter transformer; ki_description: 83mA Regulated 1W DC/DC converter with 1.5kV isolation, 18V-36V input, 12V fixed Output Voltage, SIP-6; ki_fp_filters: Converter*DCDC*TRACO*TMR?1*Single*; Footprint: Converter_DCDC:Converter_DCDC_TRACO_TMR-1-xxxx_Single_THT; Datasheet: http://assets.tracopower.com/TMR1/documents/tmr1-datasheet.pdf
pins: 1 -VIN, 2 +VIN, 4 +VOUT, 6 -VOUT

## TMR_1-2412SM
designator *  value TMR_1-2412SM  Reference: U
ki_keywords: Murata isolated isolation dc-dc converter transformer; ki_description: 83mA Regulated 1W DC/DC converter with 1.5kV isolation, 18V-36V input, 12V fixed Output Voltage, SMD; ki_fp_filters: Converter*DCDC*TRACO*TMR?1SM*; Footprint: Converter_DCDC:Converter_DCDC_TRACO_TMR-1SM_SMD; Datasheet: http://assets.tracopower.com/TMR1SM/documents/tmr1sm-datasheet.pdf
pins: 1 -VIN, 2 Remote_on/off, 6 NC hidden, 7 NC hidden, 8 +VOUT, 9 -VOUT, 14 +VIN

## TMR_1-2413
designator *  value TMR_1-2413  Reference: U
ki_keywords: Murata isolated isolation dc-dc converter transformer; ki_description: 67mA Regulated 1W DC/DC converter with 1.5kV isolation, 18V-36V input, 15V fixed Output Voltage, SIP-6; ki_fp_filters: Converter*DCDC*TRACO*TMR?1*Single*; Footprint: Converter_DCDC:Converter_DCDC_TRACO_TMR-1-xxxx_Single_THT; Datasheet: http://assets.tracopower.com/TMR1/documents/tmr1-datasheet.pdf
pins: 1 -VIN, 2 +VIN, 4 +VOUT, 6 -VOUT

## TMR_1-2413SM
designator *  value TMR_1-2413SM  Reference: U
ki_keywords: Murata isolated isolation dc-dc converter transformer; ki_description: 67mA Regulated 1W DC/DC converter with 1.5kV isolation, 18V-36V input, 15V fixed Output Voltage, SMD; ki_fp_filters: Converter*DCDC*TRACO*TMR?1SM*; Footprint: Converter_DCDC:Converter_DCDC_TRACO_TMR-1SM_SMD; Datasheet: http://assets.tracopower.com/TMR1SM/documents/tmr1sm-datasheet.pdf
pins: 1 -VIN, 2 Remote_on/off, 6 NC hidden, 7 NC hidden, 8 +VOUT, 9 -VOUT, 14 +VIN

## TMR_1-2415
designator *  value TMR_1-2415  Reference: U
ki_keywords: Murata isolated isolation dc-dc converter transformer; ki_description: 42mA Regulated 1W DC/DC converter with 1.5kV isolation, 18V-36V input, 24V fixed Output Voltage, SIP-6; ki_fp_filters: Converter*DCDC*TRACO*TMR?1*Single*; Footprint: Converter_DCDC:Converter_DCDC_TRACO_TMR-1-xxxx_Single_THT; Datasheet: http://assets.tracopower.com/TMR1/documents/tmr1-datasheet.pdf
pins: 1 -VIN, 2 +VIN, 4 +VOUT, 6 -VOUT

## TMR_1-2422
designator *  value TMR_1-2422  Reference: U
ki_keywords: Murata isolated isolation dc-dc converter transformer; ki_description: +/-42mA Regulated 1W DC/DC converter with 1.5kV isolation, 18V-36V input, +/-12V fixed Output Voltage, SIP-6; ki_fp_filters: Converter*DCDC*TRACO*TMR?1*Dual*; Footprint: Converter_DCDC:Converter_DCDC_TRACO_TMR-1-xxxx_Dual_THT; Datasheet: http://assets.tracopower.com/TMR1/documents/tmr1-datasheet.pdf
pins: 1 -VIN, 2 +VIN, 4 +VOUT, 5 Common, 6 -VOUT

## TMR_1-2422SM
designator *  value TMR_1-2422SM  Reference: U
ki_keywords: Murata isolated isolation dc-dc converter transformer; ki_description: +/-42mA Regulated 1W DC/DC converter with 1.5kV isolation, 18V-36V input, +/-12V fixed Output Voltage, SMD; ki_fp_filters: Converter*DCDC*TRACO*TMR-1SM*SMD*; Footprint: Converter_DCDC:Converter_DCDC_TRACO_TMR-1SM_SMD; Datasheet: http://assets.tracopower.com/TMR1SM/documents/tmr1sm-datasheet.pdf
pins: 1 -VIN, 2 Remote_on/off, 6 Common hidden, 7 -VOUT, 8 +VOUT, 9 Common, 14 +VIN

## TMR_1-2423
designator *  value TMR_1-2423  Reference: U
ki_keywords: Murata isolated isolation dc-dc converter transformer; ki_description: +/-33mA Regulated 1W DC/DC converter with 1.5kV isolation, 18V-36V input, +/-15V fixed Output Voltage, SIP-6; ki_fp_filters: Converter*DCDC*TRACO*TMR?1*Dual*; Footprint: Converter_DCDC:Converter_DCDC_TRACO_TMR-1-xxxx_Dual_THT; Datasheet: http://assets.tracopower.com/TMR1/documents/tmr1-datasheet.pdf
pins: 1 -VIN, 2 +VIN, 4 +VOUT, 5 Common, 6 -VOUT

## TMR_1-2423SM
designator *  value TMR_1-2423SM  Reference: U
ki_keywords: Murata isolated isolation dc-dc converter transformer; ki_description: +/-33mA Regulated 1W DC/DC converter with 1.5kV isolation, 18V-36V input, +/-15V fixed Output Voltage, SMD; ki_fp_filters: Converter*DCDC*TRACO*TMR-1SM*SMD*; Footprint: Converter_DCDC:Converter_DCDC_TRACO_TMR-1SM_SMD; Datasheet: http://assets.tracopower.com/TMR1SM/documents/tmr1sm-datasheet.pdf
pins: 1 -VIN, 2 Remote_on/off, 6 Common hidden, 7 -VOUT, 8 +VOUT, 9 Common, 14 +VIN

## TMR_1-4811
designator *  value TMR_1-4811  Reference: U
ki_keywords: Murata isolated isolation dc-dc converter transformer; ki_description: 200mA Regulated 1W DC/DC converter with 1.5kV isolation, 36V-75V input, 5V fixed Output Voltage, SIP-6; ki_fp_filters: Converter*DCDC*TRACO*TMR?1*Single*; Footprint: Converter_DCDC:Converter_DCDC_TRACO_TMR-1-xxxx_Single_THT; Datasheet: http://assets.tracopower.com/TMR1/documents/tmr1-datasheet.pdf
pins: 1 -VIN, 2 +VIN, 4 +VOUT, 6 -VOUT

## TMR_1-4811SM
designator *  value TMR_1-4811SM  Reference: U
ki_keywords: Murata isolated isolation dc-dc converter transformer; ki_description: 200mA Regulated 1W DC/DC converter with 1.5kV isolation, 36V-75V input, 5V fixed Output Voltage, SMD; ki_fp_filters: Converter*DCDC*TRACO*TMR?1SM*; Footprint: Converter_DCDC:Converter_DCDC_TRACO_TMR-1SM_SMD; Datasheet: http://assets.tracopower.com/TMR1SM/documents/tmr1sm-datasheet.pdf
pins: 1 -VIN, 2 Remote_on/off, 6 NC hidden, 7 NC hidden, 8 +VOUT, 9 -VOUT, 14 +VIN

## TMR_1-4812
designator *  value TMR_1-4812  Reference: U
ki_keywords: Murata isolated isolation dc-dc converter transformer; ki_description: 83mA Regulated 1W DC/DC converter with 1.5kV isolation, 36V-75V input, 12V fixed Output Voltage, SIP-6; ki_fp_filters: Converter*DCDC*TRACO*TMR?1*Single*; Footprint: Converter_DCDC:Converter_DCDC_TRACO_TMR-1-xxxx_Single_THT; Datasheet: http://assets.tracopower.com/TMR1/documents/tmr1-datasheet.pdf
pins: 1 -VIN, 2 +VIN, 4 +VOUT, 6 -VOUT

## TMR_1-4812SM
designator *  value TMR_1-4812SM  Reference: U
ki_keywords: Murata isolated isolation dc-dc converter transformer; ki_description: 83mA Regulated 1W DC/DC converter with 1.5kV isolation, 36V-75V input, 12V fixed Output Voltage, SMD; ki_fp_filters: Converter*DCDC*TRACO*TMR?1SM*; Footprint: Converter_DCDC:Converter_DCDC_TRACO_TMR-1SM_SMD; Datasheet: http://assets.tracopower.com/TMR1SM/documents/tmr1sm-datasheet.pdf
pins: 1 -VIN, 2 Remote_on/off, 6 NC hidden, 7 NC hidden, 8 +VOUT, 9 -VOUT, 14 +VIN

## TMR_1-4813
designator *  value TMR_1-4813  Reference: U
ki_keywords: Murata isolated isolation dc-dc converter transformer; ki_description: 67mA Regulated 1W DC/DC converter with 1.5kV isolation, 36V-75V input, 15V fixed Output Voltage, SIP-6; ki_fp_filters: Converter*DCDC*TRACO*TMR?1*Single*; Footprint: Converter_DCDC:Converter_DCDC_TRACO_TMR-1-xxxx_Single_THT; Datasheet: http://assets.tracopower.com/TMR1/documents/tmr1-datasheet.pdf
pins: 1 -VIN, 2 +VIN, 4 +VOUT, 6 -VOUT

## TMR_1-4813SM
designator *  value TMR_1-4813SM  Reference: U
ki_keywords: Murata isolated isolation dc-dc converter transformer; ki_description: 67mA Regulated 1W DC/DC converter with 1.5kV isolation, 36V-75V input, 15V fixed Output Voltage, SMD; ki_fp_filters: Converter*DCDC*TRACO*TMR?1SM*; Footprint: Converter_DCDC:Converter_DCDC_TRACO_TMR-1SM_SMD; Datasheet: http://assets.tracopower.com/TMR1SM/documents/tmr1sm-datasheet.pdf
pins: 1 -VIN, 2 Remote_on/off, 6 NC hidden, 7 NC hidden, 8 +VOUT, 9 -VOUT, 14 +VIN

## TMR_1-4815
designator *  value TMR_1-4815  Reference: U
ki_keywords: Murata isolated isolation dc-dc converter transformer; ki_description: 42mA Regulated 1W DC/DC converter with 1.5kV isolation, 36V-75V input, 24V fixed Output Voltage, SIP-6; ki_fp_filters: Converter*DCDC*TRACO*TMR?1*Single*; Footprint: Converter_DCDC:Converter_DCDC_TRACO_TMR-1-xxxx_Single_THT; Datasheet: http://assets.tracopower.com/TMR1/documents/tmr1-datasheet.pdf
pins: 1 -VIN, 2 +VIN, 4 +VOUT, 6 -VOUT

## TMR_1-4822
designator *  value TMR_1-4822  Reference: U
ki_keywords: Murata isolated isolation dc-dc converter transformer; ki_description: +/-42mA Regulated 1W DC/DC converter with 1.5kV isolation, 36V-75V input, +/-12V fixed Output Voltage, SIP-6; ki_fp_filters: Converter*DCDC*TRACO*TMR?1*Dual*; Footprint: Converter_DCDC:Converter_DCDC_TRACO_TMR-1-xxxx_Dual_THT; Datasheet: http://assets.tracopower.com/TMR1/documents/tmr1-datasheet.pdf
pins: 1 -VIN, 2 +VIN, 4 +VOUT, 5 Common, 6 -VOUT

## TMR_1-4822SM
designator *  value TMR_1-4822SM  Reference: U
ki_keywords: Murata isolated isolation dc-dc converter transformer; ki_description: +/-42mA Regulated 1W DC/DC converter with 1.5kV isolation, 36V-75V input, +/-12V fixed Output Voltage, SMD; ki_fp_filters: Converter*DCDC*TRACO*TMR-1SM*SMD*; Footprint: Converter_DCDC:Converter_DCDC_TRACO_TMR-1SM_SMD; Datasheet: http://assets.tracopower.com/TMR1SM/documents/tmr1sm-datasheet.pdf
pins: 1 -VIN, 2 Remote_on/off, 6 Common hidden, 7 -VOUT, 8 +VOUT, 9 Common, 14 +VIN

## TMR_1-4823
designator *  value TMR_1-4823  Reference: U
ki_keywords: Murata isolated isolation dc-dc converter transformer; ki_description: +/-33mA Regulated 1W DC/DC converter with 1.5kV isolation, 36V-75V input, +/-15V fixed Output Voltage, SIP-6; ki_fp_filters: Converter*DCDC*TRACO*TMR?1*Dual*; Footprint: Converter_DCDC:Converter_DCDC_TRACO_TMR-1-xxxx_Dual_THT; Datasheet: http://assets.tracopower.com/TMR1/documents/tmr1-datasheet.pdf
pins: 1 -VIN, 2 +VIN, 4 +VOUT, 5 Common, 6 -VOUT
